# Altium schematic symbol library jlcpcb_2025_04_inductors_extended_0805.schlib: 882 symbols (part 3 of 5) (continued)
## LS0805-1R5K-N
designator L?  Inductance: 1.5uH
Inductor, 1.5uH, ±10%, 830mΩ, 700mA, SMD 0805; Manufacturer: Chilisin Elec; Manufacturer Part Number: LS0805-1R5K-N; Self-Resonant Frequency: 330MHz; Q Factor: 20@7.9MHz; Package Size: 0805; JLCPCB Basic Part: No; JLCPCB Part Number: C280490; Supplier 1: LCSC; Category: Inductors; Supplier Part Number 1: C280490; Tolerance: ±10%; Rated Current: 700mA; DC Resistance: 830mΩ; RoHS: Yes; ComponentLink1Description: Datasheet; ComponentLink1URL: https://wmsc.lcsc.com/wmsc/upload/file/pdf/v2/lcsc/2304140030_Chilisin-Elec-LS0805-1R5K-N_C280490.pdf; ComponentLink2Description: JLCPCB Part URL; ComponentLink2URL: https://jlcpcb.com/partdetail/C280490; ComponentLink3Description: LCSC Part URL; ComponentLink3URL: https://lcsc.com/product-detail/Inductors-SMD_Chilisin-Elec-Chilisin-Elec-LS0805-1R5K-N_C280490.html
footprint IND-0805 (0805 (2012M) Inductor)
pins: 1, 2

## LS0805-2R2J-N
designator L?  Inductance: 2.2uH
Inductor, 2.2uH, ±5%, 1.1Ω, 650mA, SMD 0805; Manufacturer: Chilisin Elec; Manufacturer Part Number: LS0805-2R2J-N; Self-Resonant Frequency: 250MHz; Q Factor: 20@7.9MHz; Package Size: 0805; JLCPCB Basic Part: No; JLCPCB Part Number: C280492; Supplier 1: LCSC; Category: Inductors; Supplier Part Number 1: C280492; Tolerance: ±5%; Rated Current: 650mA; DC Resistance: 1.1Ω; RoHS: Yes; ComponentLink1Description: Datasheet; ComponentLink1URL: https://wmsc.lcsc.com/wmsc/upload/file/pdf/v2/lcsc/2304140030_Chilisin-Elec-LS0805-2R2J-N_C280492.pdf; ComponentLink2Description: JLCPCB Part URL; ComponentLink2URL: https://jlcpcb.com/partdetail/C280492; ComponentLink3Description: LCSC Part URL; ComponentLink3URL: https://lcsc.com/product-detail/Inductors-SMD_Chilisin-Elec-Chilisin-Elec-LS0805-2R2J-N_C280492.html
footprint IND-0805 (0805 (2012M) Inductor)
pins: 1, 2

## LS0805-4R7J-N
designator L?  Inductance: 4.7uH
Inductor, 4.7uH, ±5%, 1.6Ω, 530mA, SMD 0805; Manufacturer: Chilisin Elec; Manufacturer Part Number: LS0805-4R7J-N; Self-Resonant Frequency: 70MHz; Q Factor: 20@7.9MHz; Package Size: 0805; JLCPCB Basic Part: No; JLCPCB Part Number: C285882; Supplier 1: LCSC; Category: Inductors; Supplier Part Number 1: C285882; Tolerance: ±5%; Rated Current: 530mA; DC Resistance: 1.6Ω; RoHS: Yes; ComponentLink1Description: Datasheet; ComponentLink1URL: https://wmsc.lcsc.com/wmsc/upload/file/pdf/v2/lcsc/1912111437_Chilisin-Elec-LS0805-4R7J-N_C285882.pdf; ComponentLink2Description: JLCPCB Part URL; ComponentLink2URL: https://jlcpcb.com/partdetail/C285882; ComponentLink3Description: LCSC Part URL; ComponentLink3URL: https://lcsc.com/product-detail/Inductors-SMD_Chilisin-Elec-Chilisin-Elec-LS0805-4R7J-N_C285882.html
footprint IND-0805 (0805 (2012M) Inductor)
pins: 1, 2

## LS0805-5R6K-N
designator L?  Inductance: 5.6uH
Inductor, 5.6uH, ±10%, 1.7Ω, 500mA, SMD 0805; Manufacturer: Chilisin Elec; Manufacturer Part Number: LS0805-5R6K-N; Self-Resonant Frequency: 65MHz; Q Factor: 20@7.9MHz; Package Size: 0805; JLCPCB Basic Part: No; JLCPCB Part Number: C280493; Supplier 1: LCSC; Category: Inductors; Supplier Part Number 1: C280493; Tolerance: ±10%; Rated Current: 500mA; DC Resistance: 1.7Ω; RoHS: Yes; ComponentLink1Description: Datasheet; ComponentLink1URL: https://wmsc.lcsc.com/wmsc/upload/file/pdf/v2/lcsc/2304140030_Chilisin-Elec-LS0805-5R6K-N_C280493.pdf; ComponentLink2Description: JLCPCB Part URL; ComponentLink2URL: https://jlcpcb.com/partdetail/C280493; ComponentLink3Description: LCSC Part URL; ComponentLink3URL: https://lcsc.com/product-detail/Inductors-SMD_Chilisin-Elec-Chilisin-Elec-LS0805-5R6K-N_C280493.html
footprint IND-0805 (0805 (2012M) Inductor)
pins: 1, 2

## LS0805-100K-N
designator L?  Inductance: 10uH
Inductor, 10uH, ±10%, 2.4Ω, 400mA, SMD 0805; Manufacturer: Chilisin Elec; Manufacturer Part Number: LS0805-100K-N; Self-Resonant Frequency: 40MHz; Q Factor: 16@2.5MHz; Package Size: 0805; JLCPCB Basic Part: No; JLCPCB Part Number: C280489; Supplier 1: LCSC; Category: Inductors; Supplier Part Number 1: C280489; Tolerance: ±10%; Rated Current: 400mA; DC Resistance: 2.4Ω; RoHS: Yes; ComponentLink1Description: Datasheet; ComponentLink1URL: https://wmsc.lcsc.com/wmsc/upload/file/pdf/v2/lcsc/2304140030_Chilisin-Elec-LS0805-100K-N_C280489.pdf; ComponentLink2Description: JLCPCB Part URL; ComponentLink2URL: https://jlcpcb.com/partdetail/C280489; ComponentLink3Description: LCSC Part URL; ComponentLink3URL: https://lcsc.com/product-detail/Inductors-SMD_Chilisin-Elec-Chilisin-Elec-LS0805-100K-N_C280489.html
footprint IND-0805 (0805 (2012M) Inductor)
pins: 1, 2

## LS0805-220K-N
designator L?  Inductance: 22uH
Inductor, 22uH, ±10%, 5.45Ω, 270mA, SMD 0805; Manufacturer: Chilisin Elec; Manufacturer Part Number: LS0805-220K-N; Self-Resonant Frequency: 20MHz; Q Factor: 16@2.5MHz; Package Size: 0805; JLCPCB Basic Part: No; JLCPCB Part Number: C472423; Supplier 1: LCSC; Category: Inductors; Supplier Part Number 1: C472423; Tolerance: ±10%; Rated Current: 270mA; DC Resistance: 5.45Ω; RoHS: Yes; ComponentLink1Description: Datasheet; ComponentLink1URL: https://wmsc.lcsc.com/wmsc/upload/file/pdf/v2/lcsc/2304140030_Chilisin-Elec-LS0805-220K-N_C472423.pdf; ComponentLink2Description: JLCPCB Part URL; ComponentLink2URL: https://jlcpcb.com/partdetail/C472423; ComponentLink3Description: LCSC Part URL; ComponentLink3URL: https://lcsc.com/product-detail/Inductors-SMD_Chilisin-Elec-Chilisin-Elec-LS0805-220K-N_C472423.html
footprint IND-0805 (0805 (2012M) Inductor)
pins: 1, 2

## LS0805-270J-N
designator L?  Inductance: 27uH
Inductor, 27uH, ±5%, 7.8Ω, 240mA, SMD 0805; Manufacturer: Chilisin Elec; Manufacturer Part Number: LS0805-270J-N; Self-Resonant Frequency: 19MHz; Q Factor: 16@2.5MHz; Package Size: 0805; JLCPCB Basic Part: No; JLCPCB Part Number: C280491; Supplier 1: LCSC; Category: Inductors; Supplier Part Number 1: C280491; Tolerance: ±5%; Rated Current: 240mA; DC Resistance: 7.8Ω; RoHS: Yes; ComponentLink1Description: Datasheet; ComponentLink1URL: https://wmsc.lcsc.com/wmsc/upload/file/pdf/v2/lcsc/2304140030_Chilisin-Elec-LS0805-270J-N_C280491.pdf; ComponentLink2Description: JLCPCB Part URL; ComponentLink2URL: https://jlcpcb.com/partdetail/C280491; ComponentLink3Description: LCSC Part URL; ComponentLink3URL: https://lcsc.com/product-detail/Inductors-SMD_Chilisin-Elec-Chilisin-Elec-LS0805-270J-N_C280491.html
footprint IND-0805 (0805 (2012M) Inductor)
pins: 1, 2

## LS0805-R68K-N
designator L?  Inductance: 680nH
Inductor, 680nH, ±10%, 400mΩ, 800mA, SMD 0805; Manufacturer: Chilisin Elec; Manufacturer Part Number: LS0805-R68K-N; Self-Resonant Frequency: 480MHz; Q Factor: 20@7.9MHz; Package Size: 0805; JLCPCB Basic Part: No; JLCPCB Part Number: C280494; Supplier 1: LCSC; Category: Inductors; Supplier Part Number 1: C280494; Tolerance: ±10%; Rated Current: 800mA; DC Resistance: 400mΩ; RoHS: Yes; ComponentLink1Description: Datasheet; ComponentLink1URL: https://wmsc.lcsc.com/wmsc/upload/file/pdf/v2/lcsc/1912111437_Chilisin-Elec-LS0805-R68K-N_C280494.pdf; ComponentLink2Description: JLCPCB Part URL; ComponentLink2URL: https://jlcpcb.com/partdetail/C280494; ComponentLink3Description: LCSC Part URL; ComponentLink3URL: https://lcsc.com/product-detail/Inductors-SMD_Chilisin-Elec-Chilisin-Elec-LS0805-R68K-N_C280494.html
footprint IND-0805 (0805 (2012M) Inductor)
pins: 1, 2

## LT0805-R12J-N
designator L?  Inductance: 120nH
Inductor, 120nH, ±5%, 330mΩ, 1.2A, SMD 0805; Manufacturer: Chilisin Elec; Manufacturer Part Number: LT0805-R12J-N; Self-Resonant Frequency: 25.2MHz; Q Factor: 22@25.2MHz; Package Size: 0805; JLCPCB Basic Part: No; JLCPCB Part Number: C280495; Supplier 1: LCSC; Category: Inductors; Supplier Part Number 1: C280495; Tolerance: ±5%; Rated Current: 1.2A; DC Resistance: 330mΩ; RoHS: Yes; ComponentLink1Description: Datasheet; ComponentLink1URL: https://wmsc.lcsc.com/wmsc/upload/file/pdf/v2/lcsc/2304140030_Chilisin-Elec-LT0805-R12J-N_C280495.pdf; ComponentLink2Description: JLCPCB Part URL; ComponentLink2URL: https://jlcpcb.com/partdetail/C280495; ComponentLink3Description: LCSC Part URL; ComponentLink3URL: https://lcsc.com/product-detail/Inductors-SMD_Chilisin-Elec-Chilisin-Elec-LT0805-R12J-N_C280495.html
footprint IND-0805 (0805 (2012M) Inductor)
pins: 1, 2

## LT0805-R15J-N
designator L?  Inductance: 150nH
Inductor, 150nH, ±5%, 330mΩ, 1.2A, SMD 0805; Manufacturer: Chilisin Elec; Manufacturer Part Number: LT0805-R15J-N; Self-Resonant Frequency: 25.2MHz; Q Factor: 22@25.2MHz; Package Size: 0805; JLCPCB Basic Part: No; JLCPCB Part Number: C280496; Supplier 1: LCSC; Category: Inductors; Supplier Part Number 1: C280496; Tolerance: ±5%; Rated Current: 1.2A; DC Resistance: 330mΩ; RoHS: Yes; ComponentLink1Description: Datasheet; ComponentLink1URL: https://wmsc.lcsc.com/wmsc/upload/file/pdf/v2/lcsc/2304140030_Chilisin-Elec-LT0805-R15J-N_C280496.pdf; ComponentLink2Description: JLCPCB Part URL; ComponentLink2URL: https://jlcpcb.com/partdetail/C280496; ComponentLink3Description: LCSC Part URL; ComponentLink3URL: https://lcsc.com/product-detail/Inductors-SMD_Chilisin-Elec-Chilisin-Elec-LT0805-R15J-N_C280496.html
footprint IND-0805 (0805 (2012M) Inductor)
pins: 1, 2

## MCL2012A2R2MT
designator L?  Inductance: 2.2uH
Inductor, 2.2uH, ±20%, 180mΩ, 300mA, SMD 0805; Manufacturer: Sunlord; Manufacturer Part Number: MCL2012A2R2MT; Self-Resonant Frequency: 70MHz; Package Size: 0805; JLCPCB Basic Part: No; JLCPCB Part Number: C279932; Supplier 1: LCSC; Category: Inductors; Supplier Part Number 1: C279932; Tolerance: ±20%; Rated Current: 300mA; Saturation Current: 300mA; DC Resistance: 180mΩ; RoHS: Yes; ComponentLink1Description: Datasheet; ComponentLink1URL: https://wmsc.lcsc.com/wmsc/upload/file/pdf/v2/lcsc/2310271622_Sunlord-MCL2012A2R2MT_C279932.pdf; ComponentLink2Description: JLCPCB Part URL; ComponentLink2URL: https://jlcpcb.com/partdetail/C279932; ComponentLink3Description: LCSC Part URL; ComponentLink3URL: https://lcsc.com/product-detail/Inductors-SMD_Sunlord-Sunlord-MCL2012A2R2MT_C279932.html
footprint IND-0805 (0805 (2012M) Inductor)
pins: 1, 2

## MCL2012H100MT
designator L?  Inductance: 10uH
Inductor, 10uH, ±20%, 650mΩ, 100mA, SMD 0805; Manufacturer: Sunlord; Manufacturer Part Number: MCL2012H100MT; Package Size: 0805; JLCPCB Basic Part: No; JLCPCB Part Number: C95978; Supplier 1: LCSC; Category: Inductors; Supplier Part Number 1: C95978; Tolerance: ±20%; Rated Current: 100mA; DC Resistance: 650mΩ; RoHS: Yes; ComponentLink1Description: Datasheet; ComponentLink1URL: https://wmsc.lcsc.com/wmsc/upload/file/pdf/v2/lcsc/2310271623_Sunlord-MCL2012H100MT_C95978.pdf; ComponentLink2Description: JLCPCB Part URL; ComponentLink2URL: https://jlcpcb.com/partdetail/C95978; ComponentLink3Description: LCSC Part URL; ComponentLink3URL: https://lcsc.com/product-detail/Inductors-SMD_Sunlord-Sunlord-MCL2012H100MT_C95978.html
footprint IND-0805 (0805 (2012M) Inductor)
pins: 1, 2

## MCL2012S1R0MT
designator L?  Inductance: 1uH
Inductor, 1uH, ±20%, 260mΩ, 300mA, SMD 0805; Manufacturer: Sunlord; Manufacturer Part Number: MCL2012S1R0MT; Self-Resonant Frequency: 75MHz; Package Size: 0805; JLCPCB Basic Part: No; JLCPCB Part Number: C98325; Supplier 1: LCSC; Category: Inductors; Supplier Part Number 1: C98325; Tolerance: ±20%; Rated Current: 300mA; DC Resistance: 260mΩ; RoHS: Yes; ComponentLink1Description: Datasheet; ComponentLink1URL: https://wmsc.lcsc.com/wmsc/upload/file/pdf/v2/lcsc/2310301640_Sunlord-MCL2012S1R0MT_C98325.pdf; ComponentLink2Description: JLCPCB Part URL; ComponentLink2URL: https://jlcpcb.com/partdetail/C98325; ComponentLink3Description: LCSC Part URL; ComponentLink3URL: https://lcsc.com/product-detail/Inductors-SMD_Sunlord-Sunlord-MCL2012S1R0MT_C98325.html
footprint IND-0805 (0805 (2012M) Inductor)
pins: 1, 2

## MCL2012S2R2MT
designator L?  Inductance: 2.2uH
Inductor, 2.2uH, ±20%, 400mΩ, 220mA, SMD 0805; Manufacturer: Sunlord; Manufacturer Part Number: MCL2012S2R2MT; Package Size: 0805; JLCPCB Basic Part: No; JLCPCB Part Number: C95976; Supplier 1: LCSC; Category: Inductors; Supplier Part Number 1: C95976; Tolerance: ±20%; Rated Current: 220mA; DC Resistance: 400mΩ; RoHS: Yes; ComponentLink1Description: Datasheet; ComponentLink1URL: https://wmsc.lcsc.com/wmsc/upload/file/pdf/v2/lcsc/2310301640_Sunlord-MCL2012S2R2MT_C95976.pdf; ComponentLink2Description: JLCPCB Part URL; ComponentLink2URL: https://jlcpcb.com/partdetail/C95976; ComponentLink3Description: LCSC Part URL; ComponentLink3URL: https://lcsc.com/product-detail/Inductors-SMD_Sunlord-Sunlord-MCL2012S2R2MT_C95976.html
footprint IND-0805 (0805 (2012M) Inductor)
pins: 1, 2

## MCL2012S4R7MT
designator L?  Inductance: 4.7uH
Inductor, 4.7uH, ±20%, 300mΩ, 180mA, SMD 0805; Manufacturer: Sunlord; Manufacturer Part Number: MCL2012S4R7MT; Self-Resonant Frequency: 1MHz; Package Size: 0805; JLCPCB Basic Part: No; JLCPCB Part Number: C95977; Supplier 1: LCSC; Category: Inductors; Supplier Part Number 1: C95977; Tolerance: ±20%; Rated Current: 180mA; DC Resistance: 300mΩ; RoHS: Yes; ComponentLink1Description: Datasheet; ComponentLink1URL: https://wmsc.lcsc.com/wmsc/upload/file/pdf/v2/lcsc/2310301640_Sunlord-MCL2012S4R7MT_C95977.pdf; ComponentLink2Description: JLCPCB Part URL; ComponentLink2URL: https://jlcpcb.com/partdetail/C95977; ComponentLink3Description: LCSC Part URL; ComponentLink3URL: https://lcsc.com/product-detail/Inductors-SMD_Sunlord-Sunlord-MCL2012S4R7MT_C95977.html
footprint IND-0805 (0805 (2012M) Inductor)
pins: 1, 2

## MCL2012S100MT
designator L?  Inductance: 10uH
Inductor, 10uH, ±20%, 500mΩ, 60mA, SMD 0805; Manufacturer: Sunlord; Manufacturer Part Number: MCL2012S100MT; Self-Resonant Frequency: 1MHz; Package Size: 0805; JLCPCB Basic Part: No; JLCPCB Part Number: C370010; Supplier 1: LCSC; Category: Inductors; Supplier Part Number 1: C370010; Tolerance: ±20%; Rated Current: 60mA; DC Resistance: 500mΩ; RoHS: Yes; ComponentLink1Description: Datasheet; ComponentLink1URL: https://wmsc.lcsc.com/wmsc/upload/file/pdf/v2/lcsc/2310301640_Sunlord-MCL2012S100MT_C370010.pdf; ComponentLink2Description: JLCPCB Part URL; ComponentLink2URL: https://jlcpcb.com/partdetail/C370010; ComponentLink3Description: LCSC Part URL; ComponentLink3URL: https://lcsc.com/product-detail/Inductors-SMD_Sunlord-Sunlord-MCL2012S100MT_C370010.html
footprint IND-0805 (0805 (2012M) Inductor)
pins: 1, 2

## MCL2012SR22MT
designator L?  Inductance: 220nH
Inductor, 220nH, ±20%, 130mΩ, 800mA, SMD 0805; Manufacturer: Sunlord; Manufacturer Part Number: MCL2012SR22MT; Self-Resonant Frequency: 1MHz; Package Size: 0805; JLCPCB Basic Part: No; JLCPCB Part Number: C370011; Supplier 1: LCSC; Category: Inductors; Supplier Part Number 1: C370011; Tolerance: ±20%; Rated Current: 800mA; DC Resistance: 130mΩ; RoHS: Yes; ComponentLink1Description: Datasheet; ComponentLink1URL: https://wmsc.lcsc.com/wmsc/upload/file/pdf/v2/lcsc/2310301640_Sunlord-MCL2012SR22MT_C370011.pdf; ComponentLink2Description: JLCPCB Part URL; ComponentLink2URL: https://jlcpcb.com/partdetail/C370011; ComponentLink3Description: LCSC Part URL; ComponentLink3URL: https://lcsc.com/product-detail/Inductors-SMD_Sunlord-Sunlord-MCL2012SR22MT_C370011.html
footprint IND-0805 (0805 (2012M) Inductor)
pins: 1, 2

## MCL2012SR47MT
designator L?  Inductance: 470nH
Inductor, 470nH, ±20%, 180mΩ, 550mA, SMD 0805; Manufacturer: Sunlord; Manufacturer Part Number: MCL2012SR47MT; Self-Resonant Frequency: 1MHz; Package Size: 0805; JLCPCB Basic Part: No; JLCPCB Part Number: C370012; Supplier 1: LCSC; Category: Inductors; Supplier Part Number 1: C370012; Tolerance: ±20%; Rated Current: 550mA; DC Resistance: 180mΩ; RoHS: Yes; ComponentLink1Description: Datasheet; ComponentLink1URL: https://wmsc.lcsc.com/wmsc/upload/file/pdf/v2/lcsc/2310301640_Sunlord-MCL2012SR47MT_C370012.pdf; ComponentLink2Description: JLCPCB Part URL; ComponentLink2URL: https://jlcpcb.com/partdetail/C370012; ComponentLink3Description: LCSC Part URL; ComponentLink3URL: https://lcsc.com/product-detail/Inductors-SMD_Sunlord-Sunlord-MCL2012SR47MT_C370012.html
footprint IND-0805 (0805 (2012M) Inductor)
pins: 1, 2

## MGFI2012A56NKT-LF
designator L?  Inductance: 56nH
Inductor, 56nH, ±10%, 200mΩ, 300mA, SMD 0805; Manufacturer: microgate; Manufacturer Part Number: MGFI2012A56NKT-LF; Package Size: 0805; JLCPCB Basic Part: No; JLCPCB Part Number: C281073; Supplier 1: LCSC; Category: Inductors; Supplier Part Number 1: C281073; Tolerance: ±10%; Rated Current: 300mA; DC Resistance: 200mΩ; RoHS: Yes; ComponentLink1Description: Datasheet; ComponentLink1URL: https://wmsc.lcsc.com/wmsc/upload/file/pdf/v2/lcsc/2304140030_microgate-MGFI2012A56NKT-LF_C281073.pdf; ComponentLink2Description: JLCPCB Part URL; ComponentLink2URL: https://jlcpcb.com/partdetail/C281073; ComponentLink3Description: LCSC Part URL; ComponentLink3URL: https://lcsc.com/product-detail/Inductors-SMD_microgate-microgate-MGFI2012A56NKT-LF_C281073.html
footprint IND-0805 (0805 (2012M) Inductor)
pins: 1, 2

## MGFI2012A82NKT-LF
designator L?  Inductance: 82nH
Inductor, 82nH, ±10%, 200mΩ, 300mA, SMD 0805; Manufacturer: microgate; Manufacturer Part Number: MGFI2012A82NKT-LF; Package Size: 0805; JLCPCB Basic Part: No; JLCPCB Part Number: C281075; Supplier 1: LCSC; Category: Inductors; Supplier Part Number 1: C281075; Tolerance: ±10%; Rated Current: 300mA; DC Resistance: 200mΩ; RoHS: Yes; ComponentLink1Description: Datasheet; ComponentLink1URL: https://wmsc.lcsc.com/wmsc/upload/file/pdf/v2/lcsc/2304140030_microgate-MGFI2012A82NKT-LF_C281075.pdf; ComponentLink2Description: JLCPCB Part URL; ComponentLink2URL: https://jlcpcb.com/partdetail/C281075; ComponentLink3Description: LCSC Part URL; ComponentLink3URL: https://lcsc.com/product-detail/Inductors-SMD_microgate-microgate-MGFI2012A82NKT-LF_C281075.html
footprint IND-0805 (0805 (2012M) Inductor)
pins: 1, 2

## MGFI2012AR10KT-LF
designator L?  Inductance: 100nH
Inductor, 100nH, ±10%, 300mΩ, 250mA, SMD 0805; Manufacturer: microgate; Manufacturer Part Number: MGFI2012AR10KT-LF; Package Size: 0805; JLCPCB Basic Part: No; JLCPCB Part Number: C281076; Supplier 1: LCSC; Category: Inductors; Supplier Part Number 1: C281076; Tolerance: ±10%; Rated Current: 250mA; DC Resistance: 300mΩ; RoHS: Yes; ComponentLink1Description: Datasheet; ComponentLink1URL: https://wmsc.lcsc.com/wmsc/upload/file/pdf/v2/lcsc/2304140030_microgate-MGFI2012AR10KT-LF_C281076.pdf; ComponentLink2Description: JLCPCB Part URL; ComponentLink2URL: https://jlcpcb.com/partdetail/C281076; ComponentLink3Description: LCSC Part URL; ComponentLink3URL: https://lcsc.com/product-detail/Inductors-SMD_microgate-microgate-MGFI2012AR10KT-LF_C281076.html
footprint IND-0805 (0805 (2012M) Inductor)
pins: 1, 2

## MGFI2012AR12KT-LF
designator L?  Inductance: 120nH
Inductor, 120nH, ±10%, 300mΩ, 250mA, SMD 0805; Manufacturer: microgate; Manufacturer Part Number: MGFI2012AR12KT-LF; Package Size: 0805; JLCPCB Basic Part: No; JLCPCB Part Number: C281077; Supplier 1: LCSC; Category: Inductors; Supplier Part Number 1: C281077; Tolerance: ±10%; Rated Current: 250mA; DC Resistance: 300mΩ; RoHS: Yes; ComponentLink1Description: Datasheet; ComponentLink1URL: https://wmsc.lcsc.com/wmsc/upload/file/pdf/v2/lcsc/2304140030_microgate-MGFI2012AR12KT-LF_C281077.pdf; ComponentLink2Description: JLCPCB Part URL; ComponentLink2URL: https://jlcpcb.com/partdetail/C281077; ComponentLink3Description: LCSC Part URL; ComponentLink3URL: https://lcsc.com/product-detail/Inductors-SMD_microgate-microgate-MGFI2012AR12KT-LF_C281077.html
footprint IND-0805 (0805 (2012M) Inductor)
pins: 1, 2

## MGFI2012AR15KT-LF
designator L?  Inductance: 150nH
Inductor, 150nH, ±10%, 400mΩ, 250mA, SMD 0805; Manufacturer: microgate; Manufacturer Part Number: MGFI2012AR15KT-LF; Package Size: 0805; JLCPCB Basic Part: No; JLCPCB Part Number: C281078; Supplier 1: LCSC; Category: Inductors; Supplier Part Number 1: C281078; Tolerance: ±10%; Rated Current: 250mA; DC Resistance: 400mΩ; RoHS: Yes; ComponentLink1Description: Datasheet; ComponentLink1URL: https://wmsc.lcsc.com/wmsc/upload/file/pdf/v2/lcsc/2304140030_microgate-MGFI2012AR15KT-LF_C281078.pdf; ComponentLink2Description: JLCPCB Part URL; ComponentLink2URL: https://jlcpcb.com/partdetail/C281078; ComponentLink3Description: LCSC Part URL; ComponentLink3URL: https://lcsc.com/product-detail/Inductors-SMD_microgate-microgate-MGFI2012AR15KT-LF_C281078.html
footprint IND-0805 (0805 (2012M) Inductor)
pins: 1, 2

## MGFI2012AR22KT-LF
designator L?  Inductance: 220nH
Inductor, 220nH, ±10%, 500mΩ, 250mA, SMD 0805; Manufacturer: microgate; Manufacturer Part Number: MGFI2012AR22KT-LF; Package Size: 0805; JLCPCB Basic Part: No; JLCPCB Part Number: C281080; Supplier 1: LCSC; Category: Inductors; Supplier Part Number 1: C281080; Tolerance: ±10%; Rated Current: 250mA; DC Resistance: 500mΩ; RoHS: Yes; ComponentLink1Description: Datasheet; ComponentLink1URL: https://wmsc.lcsc.com/wmsc/upload/file/pdf/v2/lcsc/2304140030_microgate-MGFI2012AR22KT-LF_C281080.pdf; ComponentLink2Description: JLCPCB Part URL; ComponentLink2URL: https://jlcpcb.com/partdetail/C281080; ComponentLink3Description: LCSC Part URL; ComponentLink3URL: https://lcsc.com/product-detail/Inductors-SMD_microgate-microgate-MGFI2012AR22KT-LF_C281080.html
footprint IND-0805 (0805 (2012M) Inductor)
pins: 1, 2

## MGFI2012AR27KT-LF
designator L?  Inductance: 270nH
Inductor, 270nH, ±10%, 500mΩ, 250mA, SMD 0805; Manufacturer: microgate; Manufacturer Part Number: MGFI2012AR27KT-LF; Package Size: 0805; JLCPCB Basic Part: No; JLCPCB Part Number: C281081; Supplier 1: LCSC; Category: Inductors; Supplier Part Number 1: C281081; Tolerance: ±10%; Rated Current: 250mA; DC Resistance: 500mΩ; RoHS: Yes; ComponentLink1Description: Datasheet; ComponentLink1URL: https://wmsc.lcsc.com/wmsc/upload/file/pdf/v2/lcsc/2304140030_microgate-MGFI2012AR27KT-LF_C281081.pdf; ComponentLink2Description: JLCPCB Part URL; ComponentLink2URL: https://jlcpcb.com/partdetail/C281081; ComponentLink3Description: LCSC Part URL; ComponentLink3URL: https://lcsc.com/product-detail/Inductors-SMD_microgate-microgate-MGFI2012AR27KT-LF_C281081.html
footprint IND-0805 (0805 (2012M) Inductor)
pins: 1, 2

## MGFI2012AR47KT-LF
designator L?  Inductance: 470nH
Inductor, 470nH, ±10%, 650mΩ, 200mA, SMD 0805; Manufacturer: microgate; Manufacturer Part Number: MGFI2012AR47KT-LF; Package Size: 0805; JLCPCB Basic Part: No; JLCPCB Part Number: C281084; Supplier 1: LCSC; Category: Inductors; Supplier Part Number 1: C281084; Tolerance: ±10%; Rated Current: 200mA; DC Resistance: 650mΩ; RoHS: Yes; ComponentLink1Description: Datasheet; ComponentLink1URL: https://wmsc.lcsc.com/wmsc/upload/file/pdf/v2/lcsc/2304140030_microgate-MGFI2012AR47KT-LF_C281084.pdf; ComponentLink2Description: JLCPCB Part URL; ComponentLink2URL: https://jlcpcb.com/partdetail/C281084; ComponentLink3Description: LCSC Part URL; ComponentLink3URL: https://lcsc.com/product-detail/Inductors-SMD_microgate-microgate-MGFI2012AR47KT-LF_C281084.html
footprint IND-0805 (0805 (2012M) Inductor)
pins: 1, 2

## MGFI2012AR56KT-LF
designator L?  Inductance: 560nH
Inductor, 560nH, ±10%, 750mΩ, 150mA, SMD 0805; Manufacturer: microgate; Manufacturer Part Number: MGFI2012AR56KT-LF; Package Size: 0805; JLCPCB Basic Part: No; JLCPCB Part Number: C281085; Supplier 1: LCSC; Category: Inductors; Supplier Part Number 1: C281085; Tolerance: ±10%; Rated Current: 150mA; DC Resistance: 750mΩ; RoHS: Yes; ComponentLink1Description: Datasheet; ComponentLink1URL: https://wmsc.lcsc.com/wmsc/upload/file/pdf/v2/lcsc/2304140030_microgate-MGFI2012AR56KT-LF_C281085.pdf; ComponentLink2Description: JLCPCB Part URL; ComponentLink2URL: https://jlcpcb.com/partdetail/C281085; ComponentLink3Description: LCSC Part URL; ComponentLink3URL: https://lcsc.com/product-detail/Inductors-SMD_microgate-microgate-MGFI2012AR56KT-LF_C281085.html
footprint IND-0805 (0805 (2012M) Inductor)
pins: 1, 2

## MGFI2012AR68KT-LF
designator L?  Inductance: 680nH
Inductor, 680nH, ±10%, 800mΩ, 150mA, SMD 0805; Manufacturer: microgate; Manufacturer Part Number: MGFI2012AR68KT-LF; Package Size: 0805; JLCPCB Basic Part: No; JLCPCB Part Number: C281086; Supplier 1: LCSC; Category: Inductors; Supplier Part Number 1: C281086; Tolerance: ±10%; Rated Current: 150mA; DC Resistance: 800mΩ; RoHS: Yes; ComponentLink1Description: Datasheet; ComponentLink1URL: https://wmsc.lcsc.com/wmsc/upload/file/pdf/v2/lcsc/2304140030_microgate-MGFI2012AR68KT-LF_C281086.pdf; ComponentLink2Description: JLCPCB Part URL; ComponentLink2URL: https://jlcpcb.com/partdetail/C281086; ComponentLink3Description: LCSC Part URL; ComponentLink3URL: https://lcsc.com/product-detail/Inductors-SMD_microgate-microgate-MGFI2012AR68KT-LF_C281086.html
footprint IND-0805 (0805 (2012M) Inductor)
pins: 1, 2

## MGFI2012AR82KT-LF
designator L?  Inductance: 820nH
Inductor, 820nH, ±10%, 1Ω, 150mA, SMD 0805; Manufacturer: microgate; Manufacturer Part Number: MGFI2012AR82KT-LF; Package Size: 0805; JLCPCB Basic Part: No; JLCPCB Part Number: C281087; Supplier 1: LCSC; Category: Inductors; Supplier Part Number 1: C281087; Tolerance: ±10%; Rated Current: 150mA; DC Resistance: 1Ω; RoHS: Yes; ComponentLink1Description: Datasheet; ComponentLink1URL: https://wmsc.lcsc.com/wmsc/upload/file/pdf/v2/lcsc/2304140030_microgate-MGFI2012AR82KT-LF_C281087.pdf; ComponentLink2Description: JLCPCB Part URL; ComponentLink2URL: https://jlcpcb.com/partdetail/C281087; ComponentLink3Description: LCSC Part URL; ComponentLink3URL: https://lcsc.com/product-detail/Inductors-SMD_microgate-microgate-MGFI2012AR82KT-LF_C281087.html
footprint IND-0805 (0805 (2012M) Inductor)
pins: 1, 2

## MGFI2012C1R0KT-LF
designator L?  Inductance: 1uH
Inductor, 1uH, ±10%, 400mΩ, 50mA, SMD 0805; Manufacturer: microgate; Manufacturer Part Number: MGFI2012C1R0KT-LF; Package Size: 0805; JLCPCB Basic Part: No; JLCPCB Part Number: C281088; Supplier 1: LCSC; Category: Inductors; Supplier Part Number 1: C281088; Tolerance: ±10%; Rated Current: 50mA; DC Resistance: 400mΩ; RoHS: Yes; ComponentLink1Description: Datasheet; ComponentLink1URL: https://wmsc.lcsc.com/wmsc/upload/file/pdf/v2/lcsc/2304140030_microgate-MGFI2012C1R0KT-LF_C281088.pdf; ComponentLink2Description: JLCPCB Part URL; ComponentLink2URL: https://jlcpcb.com/partdetail/C281088; ComponentLink3Description: LCSC Part URL; ComponentLink3URL: https://lcsc.com/product-detail/Inductors-SMD_microgate-microgate-MGFI2012C1R0KT-LF_C281088.html
footprint IND-0805 (0805 (2012M) Inductor)
pins: 1, 2

## MGFI2012C1R2KT-LF
designator L?  Inductance: 1.2uH
Inductor, 1.2uH, ±10%, 500mΩ, 50mA, SMD 0805; Manufacturer: microgate; Manufacturer Part Number: MGFI2012C1R2KT-LF; Package Size: 0805; JLCPCB Basic Part: No; JLCPCB Part Number: C281089; Supplier 1: LCSC; Category: Inductors; Supplier Part Number 1: C281089; Tolerance: ±10%; Rated Current: 50mA; DC Resistance: 500mΩ; RoHS: Yes; ComponentLink1Description: Datasheet; ComponentLink1URL: https://wmsc.lcsc.com/wmsc/upload/file/pdf/v2/lcsc/2304140030_microgate-MGFI2012C1R2KT-LF_C281089.pdf; ComponentLink2Description: JLCPCB Part URL; ComponentLink2URL: https://jlcpcb.com/partdetail/C281089; ComponentLink3Description: LCSC Part URL; ComponentLink3URL: https://lcsc.com/product-detail/Inductors-SMD_microgate-microgate-MGFI2012C1R2KT-LF_C281089.html
footprint IND-0805 (0805 (2012M) Inductor)
pins: 1, 2

## MGFI2012C1R5KT-LF
designator L?  Inductance: 1.5uH
Inductor, 1.5uH, ±10%, 500mΩ, 50mA, SMD 0805; Manufacturer: microgate; Manufacturer Part Number: MGFI2012C1R5KT-LF; Package Size: 0805; JLCPCB Basic Part: No; JLCPCB Part Number: C281090; Supplier 1: LCSC; Category: Inductors; Supplier Part Number 1: C281090; Tolerance: ±10%; Rated Current: 50mA; DC Resistance: 500mΩ; RoHS: Yes; ComponentLink1Description: Datasheet; ComponentLink1URL: https://wmsc.lcsc.com/wmsc/upload/file/pdf/v2/lcsc/2304140030_microgate-MGFI2012C1R5KT-LF_C281090.pdf; ComponentLink2Description: JLCPCB Part URL; ComponentLink2URL: https://jlcpcb.com/partdetail/C281090; ComponentLink3Description: LCSC Part URL; ComponentLink3URL: https://lcsc.com/product-detail/Inductors-SMD_microgate-microgate-MGFI2012C1R5KT-LF_C281090.html
footprint IND-0805 (0805 (2012M) Inductor)
pins: 1, 2

## MGFI2012C2R2KT-LF
designator L?  Inductance: 2.2uH
Inductor, 2.2uH, ±10%, 650mΩ, 30mA, SMD 0805; Manufacturer: microgate; Manufacturer Part Number: MGFI2012C2R2KT-LF; Package Size: 0805; JLCPCB Basic Part: No; JLCPCB Part Number: C281092; Supplier 1: LCSC; Category: Inductors; Supplier Part Number 1: C281092; Tolerance: ±10%; Rated Current: 30mA; DC Resistance: 650mΩ; RoHS: Yes; ComponentLink1Description: Datasheet; ComponentLink1URL: https://wmsc.lcsc.com/wmsc/upload/file/pdf/v2/lcsc/2304140030_microgate-MGFI2012C2R2KT-LF_C281092.pdf; ComponentLink2Description: JLCPCB Part URL; ComponentLink2URL: https://jlcpcb.com/partdetail/C281092; ComponentLink3Description: LCSC Part URL; ComponentLink3URL: https://lcsc.com/product-detail/Inductors-SMD_microgate-microgate-MGFI2012C2R2KT-LF_C281092.html
footprint IND-0805 (0805 (2012M) Inductor)
pins: 1, 2

## MGFI2012C2R7KT-LF
designator L?  Inductance: 2.7uH
Inductor, 2.7uH, ±10%, 750mΩ, 30mA, SMD 0805; Manufacturer: microgate; Manufacturer Part Number: MGFI2012C2R7KT-LF; Package Size: 0805; JLCPCB Basic Part: No; JLCPCB Part Number: C281093; Supplier 1: LCSC; Category: Inductors; Supplier Part Number 1: C281093; Tolerance: ±10%; Rated Current: 30mA; DC Resistance: 750mΩ; RoHS: Yes; ComponentLink1Description: Datasheet; ComponentLink1URL: https://wmsc.lcsc.com/wmsc/upload/file/pdf/v2/lcsc/2304140030_microgate-MGFI2012C2R7KT-LF_C281093.pdf; ComponentLink2Description: JLCPCB Part URL; ComponentLink2URL: https://jlcpcb.com/partdetail/C281093; ComponentLink3Description: LCSC Part URL; ComponentLink3URL: https://lcsc.com/product-detail/Inductors-SMD_microgate-microgate-MGFI2012C2R7KT-LF_C281093.html
footprint IND-0805 (0805 (2012M) Inductor)
pins: 1, 2

## MGFI2012C3R3KT-LF
designator L?  Inductance: 3.3uH
Inductor, 3.3uH, ±10%, 800mΩ, 30mA, SMD 0805; Manufacturer: microgate; Manufacturer Part Number: MGFI2012C3R3KT-LF; Package Size: 0805; JLCPCB Basic Part: No; JLCPCB Part Number: C281094; Supplier 1: LCSC; Category: Inductors; Supplier Part Number 1: C281094; Tolerance: ±10%; Rated Current: 30mA; DC Resistance: 800mΩ; RoHS: Yes; ComponentLink1Description: Datasheet; ComponentLink1URL: https://wmsc.lcsc.com/wmsc/upload/file/pdf/v2/lcsc/2304140030_microgate-MGFI2012C3R3KT-LF_C281094.pdf; ComponentLink2Description: JLCPCB Part URL; ComponentLink2URL: https://jlcpcb.com/partdetail/C281094; ComponentLink3Description: LCSC Part URL; ComponentLink3URL: https://lcsc.com/product-detail/Inductors-SMD_microgate-microgate-MGFI2012C3R3KT-LF_C281094.html
footprint IND-0805 (0805 (2012M) Inductor)
pins: 1, 2

## MGFI2012C3R9KT-LF
designator L?  Inductance: 3.9uH
Inductor, 3.9uH, ±10%, 900mΩ, 30mA, SMD 0805; Manufacturer: microgate; Manufacturer Part Number: MGFI2012C3R9KT-LF; Package Size: 0805; JLCPCB Basic Part: No; JLCPCB Part Number: C281095; Supplier 1: LCSC; Category: Inductors; Supplier Part Number 1: C281095; Tolerance: ±10%; Rated Current: 30mA; DC Resistance: 900mΩ; RoHS: Yes; ComponentLink1Description: Datasheet; ComponentLink1URL: https://wmsc.lcsc.com/wmsc/upload/file/pdf/v2/lcsc/2304140030_microgate-MGFI2012C3R9KT-LF_C281095.pdf; ComponentLink2Description: JLCPCB Part URL; ComponentLink2URL: https://jlcpcb.com/partdetail/C281095; ComponentLink3Description: LCSC Part URL; ComponentLink3URL: https://lcsc.com/product-detail/Inductors-SMD_microgate-microgate-MGFI2012C3R9KT-LF_C281095.html
footprint IND-0805 (0805 (2012M) Inductor)
pins: 1, 2

## MGFI2012C4R7KT-LF
designator L?  Inductance: 4.7uH
Inductor, 4.7uH, ±10%, 1Ω, 30mA, SMD 0805; Manufacturer: microgate; Manufacturer Part Number: MGFI2012C4R7KT-LF; Package Size: 0805; JLCPCB Basic Part: No; JLCPCB Part Number: C281096; Supplier 1: LCSC; Category: Inductors; Supplier Part Number 1: C281096; Tolerance: ±10%; Rated Current: 30mA; DC Resistance: 1Ω; RoHS: Yes; ComponentLink1Description: Datasheet; ComponentLink1URL: https://wmsc.lcsc.com/wmsc/upload/file/pdf/v2/lcsc/2304140030_microgate-MGFI2012C4R7KT-LF_C281096.pdf; ComponentLink2Description: JLCPCB Part URL; ComponentLink2URL: https://jlcpcb.com/partdetail/C281096; ComponentLink3Description: LCSC Part URL; ComponentLink3URL: https://lcsc.com/product-detail/Inductors-SMD_microgate-microgate-MGFI2012C4R7KT-LF_C281096.html
footprint IND-0805 (0805 (2012M) Inductor)
pins: 1, 2

## MGFI2012D5R6KT-LF
designator L?  Inductance: 5.6uH
Inductor, 5.6uH, ±10%, 900mΩ, 15mA, SMD 0805; Manufacturer: microgate; Manufacturer Part Number: MGFI2012D5R6KT-LF; Package Size: 0805; JLCPCB Basic Part: No; JLCPCB Part Number: C281099; Supplier 1: LCSC; Category: Inductors; Supplier Part Number 1: C281099; Tolerance: ±10%; Rated Current: 15mA; DC Resistance: 900mΩ; RoHS: Yes; ComponentLink1Description: Datasheet; ComponentLink1URL: https://wmsc.lcsc.com/wmsc/upload/file/pdf/v2/lcsc/2304140030_microgate-MGFI2012D5R6KT-LF_C281099.pdf; ComponentLink2Description: JLCPCB Part URL; ComponentLink2URL: https://jlcpcb.com/partdetail/C281099; ComponentLink3Description: LCSC Part URL; ComponentLink3URL: https://lcsc.com/product-detail/Inductors-SMD_microgate-microgate-MGFI2012D5R6KT-LF_C281099.html
footprint IND-0805 (0805 (2012M) Inductor)
pins: 1, 2

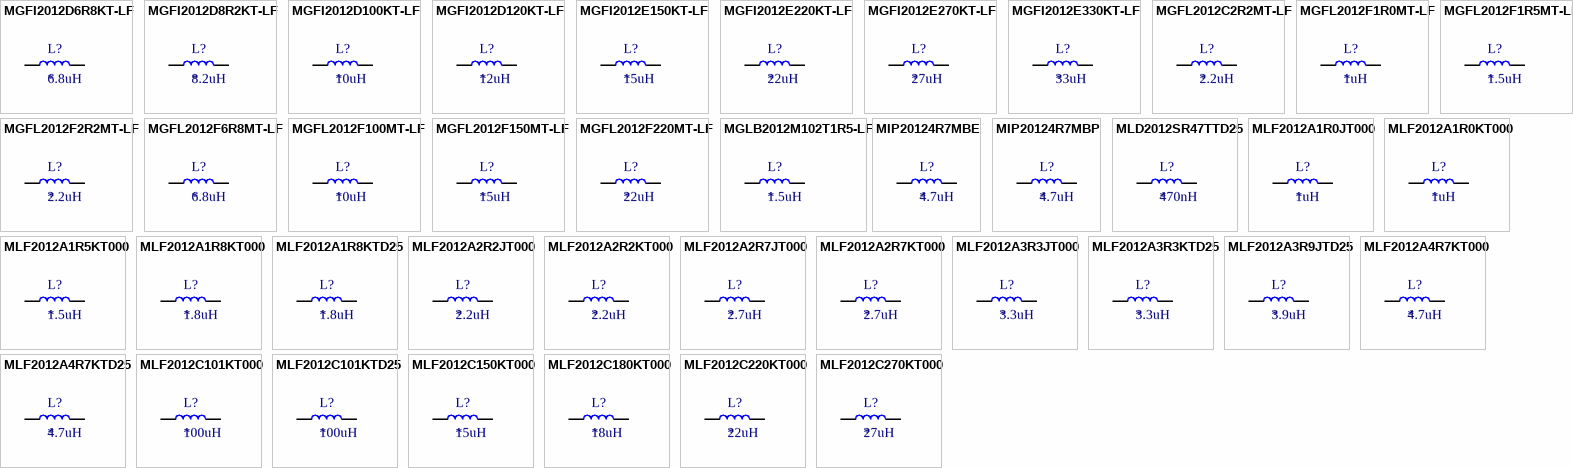
[diagram p14: symbols MGFI2012D6R8KT-LF to MLF2012C270KT000]

## MGFI2012D6R8KT-LF
designator L?  Inductance: 6.8uH
Inductor, 6.8uH, ±10%, 1Ω, 15mA, SMD 0805; Manufacturer: microgate; Manufacturer Part Number: MGFI2012D6R8KT-LF; Package Size: 0805; JLCPCB Basic Part: No; JLCPCB Part Number: C281100; Supplier 1: LCSC; Category: Inductors; Supplier Part Number 1: C281100; Tolerance: ±10%; Rated Current: 15mA; DC Resistance: 1Ω; RoHS: Yes; ComponentLink1Description: Datasheet; ComponentLink1URL: https://wmsc.lcsc.com/wmsc/upload/file/pdf/v2/lcsc/2304140030_microgate-MGFI2012D6R8KT-LF_C281100.pdf; ComponentLink2Description: JLCPCB Part URL; ComponentLink2URL: https://jlcpcb.com/partdetail/C281100; ComponentLink3Description: LCSC Part URL; ComponentLink3URL: https://lcsc.com/product-detail/Inductors-SMD_microgate-microgate-MGFI2012D6R8KT-LF_C281100.html
footprint IND-0805 (0805 (2012M) Inductor)
pins: 1, 2

## MGFI2012D8R2KT-LF
designator L?  Inductance: 8.2uH
Inductor, 8.2uH, ±10%, 1.1Ω, 15mA, SMD 0805; Manufacturer: microgate; Manufacturer Part Number: MGFI2012D8R2KT-LF; Package Size: 0805; JLCPCB Basic Part: No; JLCPCB Part Number: C281101; Supplier 1: LCSC; Category: Inductors; Supplier Part Number 1: C281101; Tolerance: ±10%; Rated Current: 15mA; DC Resistance: 1.1Ω; RoHS: Yes; ComponentLink1Description: Datasheet; ComponentLink1URL: https://wmsc.lcsc.com/wmsc/upload/file/pdf/v2/lcsc/2304140030_microgate-MGFI2012D8R2KT-LF_C281101.pdf; ComponentLink2Description: JLCPCB Part URL; ComponentLink2URL: https://jlcpcb.com/partdetail/C281101; ComponentLink3Description: LCSC Part URL; ComponentLink3URL: https://lcsc.com/product-detail/Inductors-SMD_microgate-microgate-MGFI2012D8R2KT-LF_C281101.html
footprint IND-0805 (0805 (2012M) Inductor)
pins: 1, 2

## MGFI2012D100KT-LF
designator L?  Inductance: 10uH
Inductor, 10uH, ±10%, 1.15Ω, 15mA, SMD 0805; Manufacturer: microgate; Manufacturer Part Number: MGFI2012D100KT-LF; Package Size: 0805; JLCPCB Basic Part: No; JLCPCB Part Number: C281097; Supplier 1: LCSC; Category: Inductors; Supplier Part Number 1: C281097; Tolerance: ±10%; Rated Current: 15mA; DC Resistance: 1.15Ω; RoHS: Yes; ComponentLink1Description: Datasheet; ComponentLink1URL: https://wmsc.lcsc.com/wmsc/upload/file/pdf/v2/lcsc/2304140030_microgate-MGFI2012D100KT-LF_C281097.pdf; ComponentLink2Description: JLCPCB Part URL; ComponentLink2URL: https://jlcpcb.com/partdetail/C281097; ComponentLink3Description: LCSC Part URL; ComponentLink3URL: https://lcsc.com/product-detail/Inductors-SMD_microgate-microgate-MGFI2012D100KT-LF_C281097.html
footprint IND-0805 (0805 (2012M) Inductor)
pins: 1, 2

## MGFI2012D120KT-LF
designator L?  Inductance: 12uH
Inductor, 12uH, ±10%, 1.25Ω, 15mA, SMD 0805; Manufacturer: microgate; Manufacturer Part Number: MGFI2012D120KT-LF; Package Size: 0805; JLCPCB Basic Part: No; JLCPCB Part Number: C281098; Supplier 1: LCSC; Category: Inductors; Supplier Part Number 1: C281098; Tolerance: ±10%; Rated Current: 15mA; DC Resistance: 1.25Ω; RoHS: Yes; ComponentLink1Description: Datasheet; ComponentLink1URL: https://wmsc.lcsc.com/wmsc/upload/file/pdf/v2/lcsc/2304140030_microgate-MGFI2012D120KT-LF_C281098.pdf; ComponentLink2Description: JLCPCB Part URL; ComponentLink2URL: https://jlcpcb.com/partdetail/C281098; ComponentLink3Description: LCSC Part URL; ComponentLink3URL: https://lcsc.com/product-detail/Inductors-SMD_microgate-microgate-MGFI2012D120KT-LF_C281098.html
footprint IND-0805 (0805 (2012M) Inductor)
pins: 1, 2

## MGFI2012E150KT-LF
designator L?  Inductance: 15uH
Inductor, 15uH, ±10%, 800mΩ, 5mA, SMD 0805; Manufacturer: microgate; Manufacturer Part Number: MGFI2012E150KT-LF; Package Size: 0805; JLCPCB Basic Part: No; JLCPCB Part Number: C281102; Supplier 1: LCSC; Category: Inductors; Supplier Part Number 1: C281102; Tolerance: ±10%; Rated Current: 5mA; DC Resistance: 800mΩ; RoHS: Yes; ComponentLink1Description: Datasheet; ComponentLink1URL: https://wmsc.lcsc.com/wmsc/upload/file/pdf/v2/lcsc/2304140030_microgate-MGFI2012E150KT-LF_C281102.pdf; ComponentLink2Description: JLCPCB Part URL; ComponentLink2URL: https://jlcpcb.com/partdetail/C281102; ComponentLink3Description: LCSC Part URL; ComponentLink3URL: https://lcsc.com/product-detail/Inductors-SMD_microgate-microgate-MGFI2012E150KT-LF_C281102.html
footprint IND-0805 (0805 (2012M) Inductor)
pins: 1, 2

## MGFI2012E220KT-LF
designator L?  Inductance: 22uH
Inductor, 22uH, ±10%, 1.1Ω, 5mA, SMD 0805; Manufacturer: microgate; Manufacturer Part Number: MGFI2012E220KT-LF; Package Size: 0805; JLCPCB Basic Part: No; JLCPCB Part Number: C281104; Supplier 1: LCSC; Category: Inductors; Supplier Part Number 1: C281104; Tolerance: ±10%; Rated Current: 5mA; DC Resistance: 1.1Ω; RoHS: Yes; ComponentLink1Description: Datasheet; ComponentLink1URL: https://wmsc.lcsc.com/wmsc/upload/file/pdf/v2/lcsc/2304140030_microgate-MGFI2012E220KT-LF_C281104.pdf; ComponentLink2Description: JLCPCB Part URL; ComponentLink2URL: https://jlcpcb.com/partdetail/C281104; ComponentLink3Description: LCSC Part URL; ComponentLink3URL: https://lcsc.com/product-detail/Inductors-SMD_microgate-microgate-MGFI2012E220KT-LF_C281104.html
footprint IND-0805 (0805 (2012M) Inductor)
pins: 1, 2

## MGFI2012E270KT-LF
designator L?  Inductance: 27uH
Inductor, 27uH, ±10%, 1.15Ω, 5mA, SMD 0805; Manufacturer: microgate; Manufacturer Part Number: MGFI2012E270KT-LF; Package Size: 0805; JLCPCB Basic Part: No; JLCPCB Part Number: C281105; Supplier 1: LCSC; Category: Inductors; Supplier Part Number 1: C281105; Tolerance: ±10%; Rated Current: 5mA; DC Resistance: 1.15Ω; RoHS: Yes; ComponentLink1Description: Datasheet; ComponentLink1URL: https://wmsc.lcsc.com/wmsc/upload/file/pdf/v2/lcsc/2304140030_microgate-MGFI2012E270KT-LF_C281105.pdf; ComponentLink2Description: JLCPCB Part URL; ComponentLink2URL: https://jlcpcb.com/partdetail/C281105; ComponentLink3Description: LCSC Part URL; ComponentLink3URL: https://lcsc.com/product-detail/Inductors-SMD_microgate-microgate-MGFI2012E270KT-LF_C281105.html
footprint IND-0805 (0805 (2012M) Inductor)
pins: 1, 2

## MGFI2012E330KT-LF
designator L?  Inductance: 33uH
Inductor, 33uH, ±10%, 1.25Ω, 5mA, SMD 0805; Manufacturer: microgate; Manufacturer Part Number: MGFI2012E330KT-LF; Package Size: 0805; JLCPCB Basic Part: No; JLCPCB Part Number: C281106; Supplier 1: LCSC; Category: Inductors; Supplier Part Number 1: C281106; Tolerance: ±10%; Rated Current: 5mA; DC Resistance: 1.25Ω; RoHS: Yes; ComponentLink1Description: Datasheet; ComponentLink1URL: https://wmsc.lcsc.com/wmsc/upload/file/pdf/v2/lcsc/1811151155_microgate-MGFI2012E330KT-LF_C281106.pdf; ComponentLink2Description: JLCPCB Part URL; ComponentLink2URL: https://jlcpcb.com/partdetail/C281106; ComponentLink3Description: LCSC Part URL; ComponentLink3URL: https://lcsc.com/product-detail/Inductors-SMD_microgate-microgate-MGFI2012E330KT-LF_C281106.html
footprint IND-0805 (0805 (2012M) Inductor)
pins: 1, 2

## MGFL2012C2R2MT-LF
designator L?  Inductance: 2.2uH
Inductor, 2.2uH, ±20%, 220mΩ, 800mA, SMD 0805; Manufacturer: microgate; Manufacturer Part Number: MGFL2012C2R2MT-LF; Package Size: 0805; JLCPCB Basic Part: No; JLCPCB Part Number: C281112; Supplier 1: LCSC; Category: Inductors; Supplier Part Number 1: C281112; Tolerance: ±20%; Rated Current: 800mA; DC Resistance: 220mΩ; RoHS: Yes; ComponentLink1Description: Datasheet; ComponentLink1URL: https://wmsc.lcsc.com/wmsc/upload/file/pdf/v2/lcsc/1811141845_microgate-MGFL2012C2R2MT-LF_C281112.pdf; ComponentLink2Description: JLCPCB Part URL; ComponentLink2URL: https://jlcpcb.com/partdetail/C281112; ComponentLink3Description: LCSC Part URL; ComponentLink3URL: https://lcsc.com/product-detail/Inductors-SMD_microgate-microgate-MGFL2012C2R2MT-LF_C281112.html
footprint IND-0805 (0805 (2012M) Inductor)
pins: 1, 2

## MGFL2012F1R0MT-LF
designator L?  Inductance: 1uH
Inductor, 1uH, ±20%, 150mΩ, 1.4A, SMD 0805; Manufacturer: microgate; Manufacturer Part Number: MGFL2012F1R0MT-LF; Package Size: 0805; JLCPCB Basic Part: No; JLCPCB Part Number: C281114; Supplier 1: LCSC; Category: Inductors; Supplier Part Number 1: C281114; Tolerance: ±20%; Rated Current: 1.4A; DC Resistance: 150mΩ; RoHS: Yes; ComponentLink1Description: Datasheet; ComponentLink1URL: https://wmsc.lcsc.com/wmsc/upload/file/pdf/v2/lcsc/1811141846_microgate-MGFL2012F1R0MT-LF_C281114.pdf; ComponentLink2Description: JLCPCB Part URL; ComponentLink2URL: https://jlcpcb.com/partdetail/C281114; ComponentLink3Description: LCSC Part URL; ComponentLink3URL: https://lcsc.com/product-detail/Inductors-SMD_microgate-microgate-MGFL2012F1R0MT-LF_C281114.html
footprint IND-0805 (0805 (2012M) Inductor)
pins: 1, 2

## MGFL2012F1R5MT-LF
designator L?  Inductance: 1.5uH
Inductor, 1.5uH, ±20%, 160mΩ, 1.3A, SMD 0805; Manufacturer: microgate; Manufacturer Part Number: MGFL2012F1R5MT-LF; Package Size: 0805; JLCPCB Basic Part: No; JLCPCB Part Number: C486330; Supplier 1: LCSC; Category: Inductors; Supplier Part Number 1: C486330; Tolerance: ±20%; Rated Current: 1.3A; DC Resistance: 160mΩ; RoHS: Yes; ComponentLink1Description: Datasheet; ComponentLink1URL: https://wmsc.lcsc.com/wmsc/upload/file/pdf/v2/lcsc/2304140030_microgate-MGFL2012F1R5MT-LF_C486330.pdf; ComponentLink2Description: JLCPCB Part URL; ComponentLink2URL: https://jlcpcb.com/partdetail/C486330; ComponentLink3Description: LCSC Part URL; ComponentLink3URL: https://lcsc.com/product-detail/Inductors-SMD_microgate-microgate-MGFL2012F1R5MT-LF_C486330.html
footprint IND-0805 (0805 (2012M) Inductor)
pins: 1, 2

## MGFL2012F2R2MT-LF
designator L?  Inductance: 2.2uH
Inductor, 2.2uH, ±20%, 200mΩ, 1.2A, SMD 0805; Manufacturer: microgate; Manufacturer Part Number: MGFL2012F2R2MT-LF; Package Size: 0805; JLCPCB Basic Part: No; JLCPCB Part Number: C281115; Supplier 1: LCSC; Category: Inductors; Supplier Part Number 1: C281115; Tolerance: ±20%; Rated Current: 1.2A; DC Resistance: 200mΩ; RoHS: Yes; ComponentLink1Description: Datasheet; ComponentLink1URL: https://wmsc.lcsc.com/wmsc/upload/file/pdf/v2/lcsc/1811141846_microgate-MGFL2012F2R2MT-LF_C281115.pdf; ComponentLink2Description: JLCPCB Part URL; ComponentLink2URL: https://jlcpcb.com/partdetail/C281115; ComponentLink3Description: LCSC Part URL; ComponentLink3URL: https://lcsc.com/product-detail/Inductors-SMD_microgate-microgate-MGFL2012F2R2MT-LF_C281115.html
footprint IND-0805 (0805 (2012M) Inductor)
pins: 1, 2

## MGFL2012F6R8MT-LF
designator L?  Inductance: 6.8uH
Inductor, 6.8uH, ±20%, 270mΩ, 550mA, SMD 0805; Manufacturer: microgate; Manufacturer Part Number: MGFL2012F6R8MT-LF; Package Size: 0805; JLCPCB Basic Part: No; JLCPCB Part Number: C486332; Supplier 1: LCSC; Category: Inductors; Supplier Part Number 1: C486332; Tolerance: ±20%; Rated Current: 550mA; DC Resistance: 270mΩ; RoHS: Yes; ComponentLink1Description: Datasheet; ComponentLink1URL: https://wmsc.lcsc.com/wmsc/upload/file/pdf/v2/lcsc/2304140030_microgate-MGFL2012F6R8MT-LF_C486332.pdf; ComponentLink2Description: JLCPCB Part URL; ComponentLink2URL: https://jlcpcb.com/partdetail/C486332; ComponentLink3Description: LCSC Part URL; ComponentLink3URL: https://lcsc.com/product-detail/Inductors-SMD_microgate-microgate-MGFL2012F6R8MT-LF_C486332.html
footprint IND-0805 (0805 (2012M) Inductor)
pins: 1, 2

## MGFL2012F100MT-LF
designator L?  Inductance: 10uH
Inductor, 10uH, ±20%, 320mΩ, 500mA, SMD 0805; Manufacturer: microgate; Manufacturer Part Number: MGFL2012F100MT-LF; Package Size: 0805; JLCPCB Basic Part: No; JLCPCB Part Number: C281113; Supplier 1: LCSC; Category: Inductors; Supplier Part Number 1: C281113; Tolerance: ±20%; Rated Current: 500mA; DC Resistance: 320mΩ; RoHS: Yes; ComponentLink1Description: Datasheet; ComponentLink1URL: https://wmsc.lcsc.com/wmsc/upload/file/pdf/v2/lcsc/1811141852_microgate-MGFL2012F100MT-LF_C281113.pdf; ComponentLink2Description: JLCPCB Part URL; ComponentLink2URL: https://jlcpcb.com/partdetail/C281113; ComponentLink3Description: LCSC Part URL; ComponentLink3URL: https://lcsc.com/product-detail/Inductors-SMD_microgate-microgate-MGFL2012F100MT-LF_C281113.html
footprint IND-0805 (0805 (2012M) Inductor)
pins: 1, 2

## MGFL2012F150MT-LF
designator L?  Inductance: 15uH
Inductor, 15uH, ±20%, 500mΩ, 400mA, SMD 0805; Manufacturer: microgate; Manufacturer Part Number: MGFL2012F150MT-LF; Package Size: 0805; JLCPCB Basic Part: No; JLCPCB Part Number: C486333; Supplier 1: LCSC; Category: Inductors; Supplier Part Number 1: C486333; Tolerance: ±20%; Rated Current: 400mA; DC Resistance: 500mΩ; RoHS: Yes; ComponentLink1Description: Datasheet; ComponentLink1URL: https://wmsc.lcsc.com/wmsc/upload/file/pdf/v2/lcsc/2304140030_microgate-MGFL2012F150MT-LF_C486333.pdf; ComponentLink2Description: JLCPCB Part URL; ComponentLink2URL: https://jlcpcb.com/partdetail/C486333; ComponentLink3Description: LCSC Part URL; ComponentLink3URL: https://lcsc.com/product-detail/Inductors-SMD_microgate-microgate-MGFL2012F150MT-LF_C486333.html
footprint IND-0805 (0805 (2012M) Inductor)
pins: 1, 2

## MGFL2012F220MT-LF
designator L?  Inductance: 22uH
Inductor, 22uH, ±20%, 700mΩ, 300mA, SMD 0805; Manufacturer: microgate; Manufacturer Part Number: MGFL2012F220MT-LF; Package Size: 0805; JLCPCB Basic Part: No; JLCPCB Part Number: C486334; Supplier 1: LCSC; Category: Inductors; Supplier Part Number 1: C486334; Tolerance: ±20%; Rated Current: 300mA; DC Resistance: 700mΩ; RoHS: Yes; ComponentLink1Description: Datasheet; ComponentLink1URL: https://wmsc.lcsc.com/wmsc/upload/file/pdf/v2/lcsc/2304140030_microgate-MGFL2012F220MT-LF_C486334.pdf; ComponentLink2Description: JLCPCB Part URL; ComponentLink2URL: https://jlcpcb.com/partdetail/C486334; ComponentLink3Description: LCSC Part URL; ComponentLink3URL: https://lcsc.com/product-detail/Inductors-SMD_microgate-microgate-MGFL2012F220MT-LF_C486334.html
footprint IND-0805 (0805 (2012M) Inductor)
pins: 1, 2